# Altium footprint library Stabiliser.PcbLib: 128 footprints (part 8 of 8)
Each footprint in its own frame and in the unit in brackets; x right, y up, seen from the top. Pads: shape width x height; smd on the part's side, far side on the other; paste and mask are expansions set on the pad; w line width, h text height; cw(c..) or ccw(c..) is an arc to the next point about the centre after c.
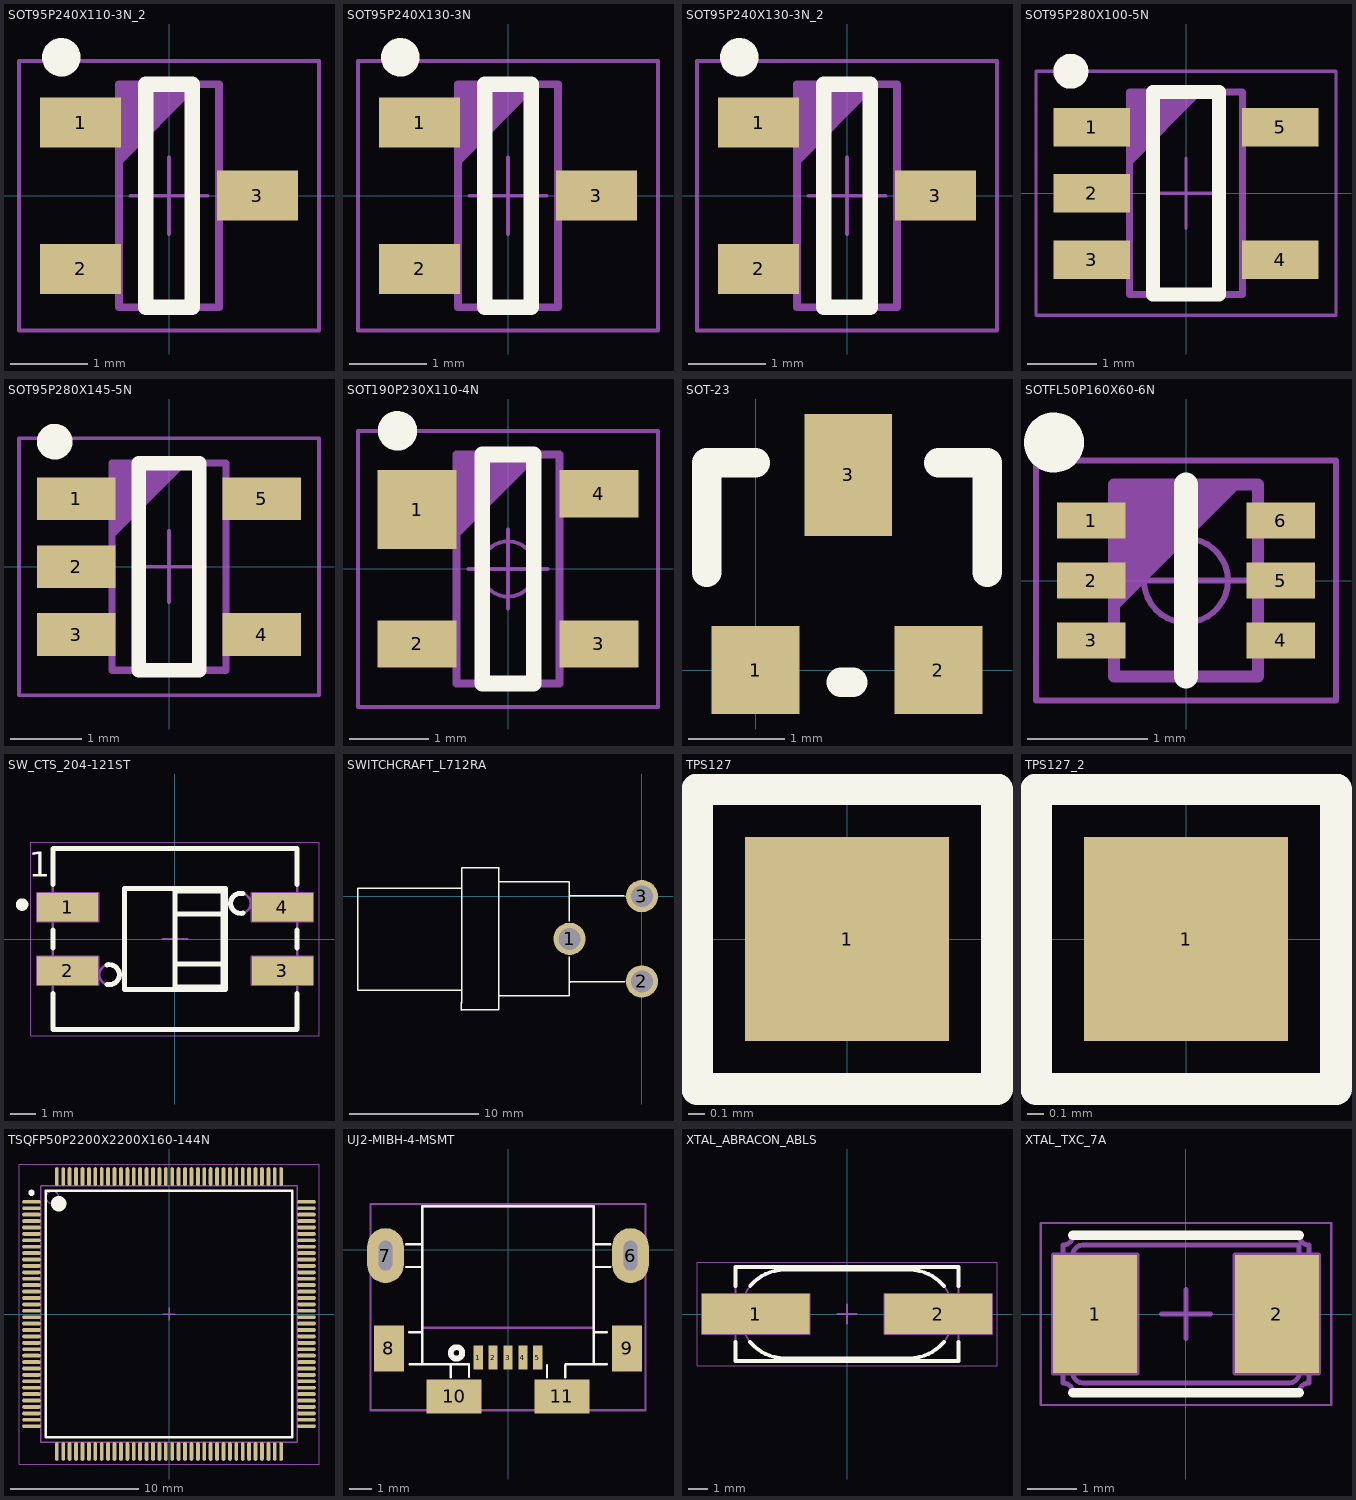
[diagram p7: the footprints below, top view; thin cyan lines are the x and y axes]

## SOT95P240X110-3N_2 [mm]
pads (3):
  rect 1.05x0.65 smd: 1(-1.15,0.95) 2(-1.15,-0.95) 3(1.15,0)
Top Overlay:
  circle w0.25: c-1.4,1.8 r0.125
  lines w0.2: -0.3,-1.45 0.3,-1.45 0.3,1.45 -0.3,1.45 -0.3,-1.45
Mechanical 14:
  lines w0.1: -0.65,0.45 0.35,1.45 ; -0.65,0.55 0.25,1.45 ; -0.65,0.65 0.15,1.45 ; -0.65,0.75 0.05,1.45 ; -0.65,0.85 -0.05,1.45 ; -0.65,0.95 -0.15,1.45 ; -0.65,1.05 -0.25,1.45 ; -0.65,1.15 -0.35,1.45 ; -0.65,1.25 -0.45,1.45 ; -0.65,1.35 -0.55,1.45 ; -0.65,-1.45 -0.65,1.45 0.65,1.45 0.65,-1.45 -0.65,-1.45
Mechanical 15:
  lines w0.05: -0.5,0 0.5,0 ; 0,-0.5 0,0.5 ; -1.95,-1.75 -1.95,1.75 1.95,1.75 1.95,-1.75 -1.95,-1.75
3D body "SOT95P240X110-3N.stp": height 1.1, standoff 0, extent -1.25,-1.5 1.25,1.5

## SOT95P240X130-3N [mm] "SOT23 3-Leads, Pitch 0.95mm - Body 1.3x2.9mm, IPC Medium Density"
height 1.3
pads (3):
  rect 1.05x0.65 smd: 1(-1.15,0.95) 2(-1.15,-0.95) 3(1.15,0)
Top Overlay:
  circle w0.25: c-1.4,1.8 r0.125
  lines w0.2: -0.3,-1.45 0.3,-1.45 0.3,1.45 -0.3,1.45 -0.3,-1.45
Mechanical 14:
  lines w0.1: -0.65,0.45 0.35,1.45 ; -0.65,0.55 0.25,1.45 ; -0.65,0.65 0.15,1.45 ; -0.65,0.75 0.05,1.45 ; -0.65,0.85 -0.05,1.45 ; -0.65,0.95 -0.15,1.45 ; -0.65,1.05 -0.25,1.45 ; -0.65,1.15 -0.35,1.45 ; -0.65,1.25 -0.45,1.45 ; -0.65,1.35 -0.55,1.45 ; -0.65,-1.45 -0.65,1.45 0.65,1.45 0.65,-1.45 -0.65,-1.45
Mechanical 15:
  lines w0.05: -0.5,0 0.5,0 ; 0,-0.5 0,0.5 ; -1.95,-1.75 -1.95,1.75 1.95,1.75 1.95,-1.75 -1.95,-1.75
3D body "SOT95P240X130-3N.stp": height 1.3, standoff 0, extent -1.25,-1.5 1.25,1.5

## SOT95P240X130-3N_2 [mm]
pads (3):
  rect 1.05x0.65 smd: 1(-1.15,0.95) 2(-1.15,-0.95) 3(1.15,0)
Top Overlay:
  circle w0.25: c-1.4,1.8 r0.125
  lines w0.2: -0.3,-1.45 -0.3,1.45 0.3,1.45 0.3,-1.45 -0.3,-1.45
Mechanical 14:
  lines w0.1: -0.65,0.45 0.35,1.45 ; -0.65,0.55 0.25,1.45 ; -0.65,0.65 0.15,1.45 ; -0.65,0.75 0.05,1.45 ; -0.65,0.85 -0.05,1.45 ; -0.65,0.95 -0.15,1.45 ; -0.65,1.05 -0.25,1.45 ; -0.65,1.15 -0.35,1.45 ; -0.65,1.25 -0.45,1.45 ; -0.65,1.35 -0.55,1.45 ; -0.65,-1.45 0.65,-1.45 0.65,1.45 -0.65,1.45 -0.65,-1.45
Mechanical 15:
  lines w0.05: -0.5,0 0.5,0 ; 0,-0.5 0,0.5 ; -1.95,-1.75 1.95,-1.75 1.95,1.75 -1.95,1.75 -1.95,-1.75
3D body "SOT95P240X130-3N.stp": height 1.3, standoff 0, extent -1.25,-1.5 1.25,1.5

## SOT95P280X100-5N [mm] "SOT23, 0.95mm pitch; 5 pin, 1.625mm W X 2.9mm L, IPC Medium Density"
height 1
pads (5):
  rect 1.1x0.55 smd: 1(-1.35,0.95) 2(-1.35,0) 3(-1.35,-0.95) 4(1.35,-0.95) 5(1.35,0.95)
Top Overlay:
  circle w0.25: c-1.65,1.75 r0.125
  lines w0.2: -0.475,-1.45 0.475,-1.45 0.475,1.45 -0.475,1.45 -0.475,-1.45
Mechanical 14:
  lines w0.1: -0.812,0.45 0.188,1.45 ; -0.812,0.55 0.088,1.45 ; -0.812,0.65 -0.012,1.45 ; -0.812,0.75 -0.112,1.45 ; -0.812,0.85 -0.212,1.45 ; -0.812,0.95 -0.312,1.45 ; -0.812,1.05 -0.412,1.45 ; -0.812,1.15 -0.512,1.45 ; -0.812,1.25 -0.612,1.45 ; -0.812,1.35 -0.712,1.45 ; -0.812,-1.45 0.812,-1.45 0.812,1.45 -0.812,1.45 -0.812,-1.45
Mechanical 15:
  lines w0.05: -0.5,0 0.5,0 ; 0,-0.5 0,0.5 ; -2.15,-1.75 2.15,-1.75 2.15,1.75 -2.15,1.75 -2.15,-1.75
3D body "SOT95P280X100-5N.stp": height 1, standoff 0, extent -1.4,-1.5 1.4,1.5

## SOT95P280X145-5N [mm] "SOT, 0.95mm pitch; 5 pin, 1.60mm W X 2.90mm L X 1.45mm H body, IPC Medium Density"
height 1.45
pads (5):
  rect 1.1x0.6 smd: 1(-1.3,0.95) 2(-1.3,0) 3(-1.3,-0.95) 4(1.3,-0.95) 5(1.3,0.95)
Top Overlay:
  circle w0.25: c-1.6,1.75 r0.125
  lines w0.2: -0.425,-1.45 0.425,-1.45 0.425,1.45 -0.425,1.45 -0.425,-1.45
Mechanical 14:
  lines w0.1: -0.8,0.45 0.2,1.45 ; -0.8,0.55 0.1,1.45 ; -0.8,0.65 0,1.45 ; -0.8,0.75 -0.1,1.45 ; -0.8,0.85 -0.2,1.45 ; -0.8,0.95 -0.3,1.45 ; -0.8,1.05 -0.4,1.45 ; -0.8,1.15 -0.5,1.45 ; -0.8,1.25 -0.6,1.45 ; -0.8,1.35 -0.7,1.45 ; -0.8,-1.45 0.8,-1.45 0.8,1.45 -0.8,1.45 -0.8,-1.45
Mechanical 15:
  lines w0.05: -0.5,0 0.5,0 ; 0,-0.5 0,0.5 ; -2.1,-1.8 2.1,-1.8 2.1,1.8 -2.1,1.8 -2.1,-1.8
3D body "SOT95P280X145-5N.stp": height 1.45, standoff 0, extent -1.4,-1.5 1.4,1.5

## SOT190P230X110-4N [mm] "SOT143, SOT, 1.90mm Pitch; 4 Pin, 1.30mm W X 2.90mm L X 1.10mm H body, IPC Medium Density"
height 1.1
pads (4):
  rect 1x1 smd: 1(-1.15,0.75)
  rect 1x0.6 smd: 2(-1.15,-0.95) 3(1.15,-0.95) 4(1.15,0.95)
Top Overlay:
  circle w0.25: c-1.4,1.75 r0.125
  lines w0.2: -0.325,-1.45 0.325,-1.45 0.325,1.45 -0.325,1.45 -0.325,-1.45
Mechanical 14:
  lines w0.1: -0.65,0.45 0.35,1.45 ; -0.65,0.55 0.25,1.45 ; -0.65,0.65 0.15,1.45 ; -0.65,0.75 0.05,1.45 ; -0.65,0.85 -0.05,1.45 ; -0.65,0.95 -0.15,1.45 ; -0.65,1.05 -0.25,1.45 ; -0.65,1.15 -0.35,1.45 ; -0.65,1.25 -0.45,1.45 ; -0.65,1.35 -0.55,1.45 ; -0.65,-1.45 0.65,-1.45 0.65,1.45 -0.65,1.45 -0.65,-1.45
Mechanical 15:
  circle w0.05: c0,0 r0.35
  lines w0.05: -0.5,0 0.5,0 ; 0,-0.5 0,0.5 ; -1.9,-1.75 1.9,-1.75 1.9,1.75 -1.9,1.75 -1.9,-1.75
3D body "SOT143N.stp": height 1.1, standoff 0, extent -1.25,-1.5 1.25,1.5

## SOT-23 [mil]
pads (3):
  rect 36x36 smd: 1(0,0) 2(75,0)
  rect 36x50 smd: 3(38,80)
Top Overlay:
  lines w12: -20,40 -20,85 0,85 ; 35,-5 40,-5 ; 75,85 95,85 95,40
3D body "SOT95P229X119-3N.stp": height 46.85, standoff 0.08, extent -21,-5.21 97.11,93.21

## SOTFL50P160X60-6N [mm] "SOTFL (SOT666), 0.50mm, Pitch; 6 Pin, 1.20mm W X 1.60mm L X 0.60mm H Body, IPC Medium Density"
height 0.6
pads (6):
  rect 0.57x0.3 smd: 1(-0.79,0.5) 2(-0.79,0) 3(-0.79,-0.5) 4(0.79,-0.5) 5(0.79,0) 6(0.79,0.5)
Top Overlay:
  circle w0.25: c-1.1,1.15 r0.125
  lines w0.2: 0,-0.8 0,0.8
Mechanical 14:
  lines w0.1: -0.6,-0.2 0.4,0.8 ; -0.6,-0.1 0.3,0.8 ; -0.6,0 0.2,0.8 ; -0.6,0.1 0.1,0.8 ; -0.6,0.2 0,0.8 ; -0.6,0.3 -0.1,0.8 ; -0.6,0.4 -0.2,0.8 ; -0.6,0.5 -0.3,0.8 ; -0.6,0.6 -0.4,0.8 ; -0.6,0.7 -0.5,0.8 ; -0.6,-0.8 -0.6,0.8 0.6,0.8 0.6,-0.8 -0.6,-0.8
Mechanical 15:
  circle w0.05: c0,0 r0.35
  lines w0.05: -0.5,0 0.5,0 ; 0,-0.5 0,0.5 ; -1.25,-1 -1.25,1 1.25,1 1.25,-1 -1.25,-1
3D body "SOTFL50P160X60-6N.stp": height 0.6, standoff 0, extent -0.85,-0.85 0.85,0.85

## SW_CTS_204-121ST [mm] "Body 7.26 x 9.78mm SPDT DIP Switch, 204 Series"
height 10.36
pads (4):
  rect 2.44x1.13 smd: 1(-4.3,1.27) 2(-4.3,-1.27) 3(4.3,-1.27) 4(4.3,1.27)
Top Overlay:
  circle w0.25: c-6.125,1.38 r0.125
  lines w0.2: -4.89,-2.185 -4.89,-3.63 4.89,-3.63 4.89,-2.185 ; -4.89,-0.355 -4.89,0.355 ; -4.89,2.185 -4.89,3.63 4.89,3.63 4.89,2.185 ; -2.73,-1.817 ccw(c-2.63,-1.43) -2.73,-1.043 ; 0,-1 1.93,-1 ; 0,1 1.93,1 ; 2.73,1.043 cw(c2.63,1.43) 2.73,1.817 ; 4.89,-0.355 4.89,0.355 ; -2.03,-2.03 -2.03,2.03 2.03,2.03 2.03,-2.03 -2.03,-2.03 ; 0,-1.93 1.93,-1.93 1.93,1.93 0,1.93 0,-1.93
  text "1" at -5.86,2.499 h1
Mechanical 8:
  lines w0.1: -0.5,0 0,0 ; 0,-0.5 0,0 ; 0,0.5 0,0 ; 0.5,0 0,0 ; -5.52,-1.835 -4.3,-1.27 -5.52,-0.705 ; -5.52,-1.835 -5.52,-0.705 ; -5.52,-1.835 -3.08,-1.835 -3.08,-0.705 -5.52,-0.705 ; -5.52,0.705 -4.3,1.27 -5.52,1.835 ; -5.52,0.705 -5.52,1.835 ; -5.52,0.705 -3.08,0.705 -3.08,1.835 -5.52,1.835 ; 5.52,-1.835 4.3,-1.27 5.52,-0.705 ; 5.52,-1.835 3.08,-1.835 3.08,-0.705 5.52,-0.705 ; 5.52,-1.835 5.52,-0.705 ; 5.52,0.705 4.3,1.27 5.52,1.835 ; 5.52,0.705 3.08,0.705 3.08,1.835 5.52,1.835 ; 5.52,0.705 5.52,1.835
Mechanical 14:
  circle w0.1: c-2.63,-1.43 r0.4
  circle w0.1: c2.63,1.43 r0.4
  lines w0.1: -4.89,-1.51 -5.2,-1.51 -5.2,-1.03 -4.89,-1.03 ; -4.89,1.03 -5.2,1.03 -5.2,1.51 -4.89,1.51 ; 0,-1 1.93,-1 ; 0,1 1.93,1 ; 4.89,-1.51 5.2,-1.51 5.2,-1.03 4.89,-1.03 ; 4.89,1.03 5.2,1.03 5.2,1.51 4.89,1.51 ; -4.89,-3.63 4.89,-3.63 4.89,3.63 -4.89,3.63 -4.89,-3.63 ; -2.03,-2.03 -2.03,2.03 2.03,2.03 2.03,-2.03 -2.03,-2.03 ; 0,-1.93 1.93,-1.93 1.93,1.93 0,1.93 0,-1.93
  text "1" at -5.859,2.504 h1
Mechanical 15:
  lines w0.05: -5.77,-3.88 5.77,-3.88 5.77,3.88 -5.77,3.88 -5.77,-3.88
3D body "SW_CTS_204-121ST.stp": height 9.76, standoff 0, extent -5.2,-3.63 5.2,3.63

## SWITCHCRAFT_L712RA [mm] "CONN PWR JACK 2.5X5.5MM SOLDER"
height 5.842
pads (3):
  round 2.5 hole 1.7: 1(-5.6,-3.3) 2(0,-6.6) 3(0,0)
Top Overlay:
  lines w0.1: -13.995,0.61 -21.996,0.61 -21.996,-7.264 -21.971,-7.29 -13.97,-7.29 ; -13.97,-8.204 -13.995,-8.23 -13.995,-8.839 -13.97,-8.814 -11.1,-8.814 -11.1,1.575 ; -13.96,-8.3 -13.96,1.7 -13.96,2.169 -13.919,2.21 -13.64,2.21 -11.049,2.21 -11.1,2.159 -11.1,1.524 ; -11.1,-7.722 -11.096,-7.718 -5.611,-7.718 ; -11.1,1.067 -11.047,1.12 -5.611,1.12 -5.611,-1.928 -5.613,-1.93 ; -5.613,-7.722 -5.613,-4.674 ; -5.588,-6.655 -5.563,-6.629 -1.321,-6.629 ; -5.588,0.025 -5.563,0.051 -1.372,0.051
3D body "L712RAmod.stp": height 13.9, standoff -3.55, extent -21.996,-8.839 1.351,2.185

## TPS127 [mm] "1.27 x  1.27mm SMD Test Point Area"
height 0.95
pads (1):
  rect 1.27x1.27 smd paste-1.27: 1(0,0)
Top Overlay:
  lines w0.2: -0.935,-0.935 0.935,-0.935 0.935,0.935 -0.935,0.935 -0.935,-0.935
Mechanical 14:
  lines w0.1: -0.585,-0.585 0.585,-0.585 0.585,0.585 -0.585,0.585 -0.585,-0.585

## TPS127_2 [mm]
pads (1):
  rect 1.27x1.27 smd paste-1.27: 1(0,0)
Top Overlay:
  lines w0.2: -0.935,-0.935 0.935,-0.935 0.935,0.935 -0.935,0.935 -0.935,-0.935
Mechanical 14:
  lines w0.1: -0.935,-0.935 0.935,-0.935 0.935,0.935 -0.935,0.935 -0.935,-0.935

## TSQFP50P2200X2200X160-144N [mm] "TSQFP, 144-Leads, Body 20.00x20.00mm, Pitch 0.50mm, IPC Medium Density"
height 1.6
pads (144):
  oval 1.45x0.3 smd: 1(-10.725,8.75) 2(-10.725,8.25) 3(-10.725,7.75) 4(-10.725,7.25) 5(-10.725,6.75) 6(-10.725,6.25) 7(-10.725,5.75) 8(-10.725,5.25) 9(-10.725,4.75) 10(-10.725,4.25) 11(-10.725,3.75) 12(-10.725,3.25) 13(-10.725,2.75) 14(-10.725,2.25) 15(-10.725,1.75) 16(-10.725,1.25) 17(-10.725,0.75) 18(-10.725,0.25) 19(-10.725,-0.25) 20(-10.725,-0.75) 21(-10.725,-1.25) 22(-10.725,-1.75) 23(-10.725,-2.25) 24(-10.725,-2.75) 25(-10.725,-3.25) 26(-10.725,-3.75) 27(-10.725,-4.25) 28(-10.725,-4.75) 29(-10.725,-5.25) 30(-10.725,-5.75) 31(-10.725,-6.25) 32(-10.725,-6.75) 33(-10.725,-7.25) 34(-10.725,-7.75) 35(-10.725,-8.25) 36(-10.725,-8.75) 73(10.725,-8.75) 74(10.725,-8.25) 75(10.725,-7.75) 76(10.725,-7.25) 77(10.725,-6.75) 78(10.725,-6.25) 79(10.725,-5.75) 80(10.725,-5.25) 81(10.725,-4.75) 82(10.725,-4.25) 83(10.725,-3.75) 84(10.725,-3.25) 85(10.725,-2.75) 86(10.725,-2.25) 87(10.725,-1.75) 88(10.725,-1.25) 89(10.725,-0.75) 90(10.725,-0.25) 91(10.725,0.25) 92(10.725,0.75) 93(10.725,1.25) 94(10.725,1.75) 95(10.725,2.25) 96(10.725,2.75) 97(10.725,3.25) 98(10.725,3.75) 99(10.725,4.25) 100(10.725,4.75) 101(10.725,5.25) 102(10.725,5.75) 103(10.725,6.25) 104(10.725,6.75) 105(10.725,7.25) 106(10.725,7.75) 107(10.725,8.25) 108(10.725,8.75)
  oval 0.3x1.45 smd: 37(-8.75,-10.725) 38(-8.25,-10.725) 39(-7.75,-10.725) 40(-7.25,-10.725) 41(-6.75,-10.725) 42(-6.25,-10.725) 43(-5.75,-10.725) 44(-5.25,-10.725) 45(-4.75,-10.725) 46(-4.25,-10.725) 47(-3.75,-10.725) 48(-3.25,-10.725) 49(-2.75,-10.725) 50(-2.25,-10.725) 51(-1.75,-10.725) 52(-1.25,-10.725) 53(-0.75,-10.725) 54(-0.25,-10.725) 55(0.25,-10.725) 56(0.75,-10.725) 57(1.25,-10.725) 58(1.75,-10.725) 59(2.25,-10.725) 60(2.75,-10.725) 61(3.25,-10.725) 62(3.75,-10.725) 63(4.25,-10.725) 64(4.75,-10.725) 65(5.25,-10.725) 66(5.75,-10.725) 67(6.25,-10.725) 68(6.75,-10.725) 69(7.25,-10.725) 70(7.75,-10.725) 71(8.25,-10.725) 72(8.75,-10.725) 109(8.75,10.725) 110(8.25,10.725) 111(7.75,10.725) 112(7.25,10.725) 113(6.75,10.725) 114(6.25,10.725) 115(5.75,10.725) 116(5.25,10.725) 117(4.75,10.725) 118(4.25,10.725) 119(3.75,10.725) 120(3.25,10.725) 121(2.75,10.725) 122(2.25,10.725) 123(1.75,10.725) 124(1.25,10.725) 125(0.75,10.725) 126(0.25,10.725) 127(-0.25,10.725) 128(-0.75,10.725) 129(-1.25,10.725) 130(-1.75,10.725) 131(-2.25,10.725) 132(-2.75,10.725) 133(-3.25,10.725) 134(-3.75,10.725) 135(-4.25,10.725) 136(-4.75,10.725) 137(-5.25,10.725) 138(-5.75,10.725) 139(-6.25,10.725) 140(-6.75,10.725) 141(-7.25,10.725) 142(-7.75,10.725) 143(-8.25,10.725) 144(-8.75,10.725)
Top Overlay:
  circle w0.6: c-8.6,8.6 r0.3
  circle w0.25: c-10.725,9.45 r0.125
  lines w0.2: -9.6,-9.6 9.6,-9.6 9.6,9.6 -9.6,9.6 -9.6,-9.6
Mechanical 13:
  circle w0.1: c-9.1,9.1 r0.5
  lines w0.1: -10,-10 10,-10 10,10 -10,10 -10,-10
Mechanical 15:
  lines w0.05: -11.7,-11.7 11.7,-11.7 11.7,11.7 -11.7,11.7 -11.7,-11.7
  lines w0.1: -0.5,0 0.5,0 ; 0,-0.5 0,0.5
3D body "TSQFP50P2200X2200X160-144N.step": height 1.6, standoff 0, extent -11,-11 11,11

## UJ2-MIBH-4-MSMT [mm] "Micro USB mid mount"
height 10.94
pads (11):
  rect 0.4x1.05 smd: 1(-1.3,-4.7) 2(-0.65,-4.7) 3(0,-4.7) 4(0.65,-4.7) 5(1.3,-4.7)
  oval 1.6x2.4 hole 0.6 slot 1.3 at 90 deg: 6(5.35,-0.25) 7(-5.35,-0.25)
  rect 1.3x2 smd: 8(-5.2,-4.3) 9(5.2,-4.3)
  rect 2.4x1.5 smd: 10(-2.35,-6.4) 11(2.35,-6.4)
Top Overlay:
  circle w0.254: c-2.25,-4.5 r0.25
  lines w0.1: -4.45,-0.75 -3.75,-0.75 ; -4.45,0.25 -3.75,0.25 ; -4.325,-3.6 -3.75,-3.6 ; -4.3,-5 -1.7,-5 -1.7,-5.55 ; -3.75,-5 -3.75,-4.8 -3.75,1.9 3.75,1.9 3.75,-4.8 ; -2.5,-5.575 -2.5,-5 ; 1.7,-5.575 1.7,-5.025 ; 2.5,-5.575 2.5,-5.025 2.525,-5 3.75,-5 ; 3.75,-3.6 4.325,-3.6 ; 3.75,-3.2 3.75,-5 ; 3.75,-0.75 4.475,-0.75 ; 3.75,0.25 4.475,0.25 ; 4.325,-5 4.325,-5 3.75,-5 ; 4.475,-0.75 4.475,-0.75
Mechanical 1:
  lines w0.1: -3.75,-3.4 3.75,-3.4 3.75,1.9 -3.75,1.9 -3.75,-3.4
Mechanical 15:
  lines w0.1: -6,-7 -6,2 6,2 6,-7 -6,-7
3D body "CUI_UJ2-MIBH-4-MSMT.step": height 0.9, standoff -1.81, extent -5.5,-6.8 5.5,1.9

## XTAL_ABRACON_ABLS [mm] "HC/49US (AT49) SMD Cristal, Body 11.4x4.7mm, ABLS Serie"
height 4.3
pads (2):
  rect 5.6x2.1 smd: 1(-4.75,0) 2(4.75,0)
Top Overlay:
  lines w0.2: -5.8,-1.45 -5.8,-2.45 5.8,-2.45 ; -5.8,1.45 -5.8,2.45 5.8,2.45 5.8,1.45 ; -5.036,-1.45 ccw(c-3.25,0) -3.25,-2.3 3.25,-2.3 ccw(c3.25,0) 5.035,-1.45 ; -5.035,1.45 cw(c-3.25,0) -3.25,2.299 ; -3.25,2.3 3.25,2.3 cw(c3.25,0) 5.035,1.45 ; 1.45,-2.45 5.8,-2.45 ; 5.8,-1.45 5.8,-2.45
Mechanical 8:
  lines w0.1: -5.75,0 -4.75,0 ; -5.25,0 -4.75,0 ; -4.75,-1 -4.75,0 ; -4.75,-0.5 -4.75,0 ; -4.75,0.5 -4.75,0 ; -4.75,1 -4.75,0 ; -4.25,0 -4.75,0 ; -3.75,0 -4.75,0 ; -0.5,0 0,0 ; 0,-0.5 0,0 ; 0,0.5 0,0 ; 0.5,0 0,0 ; 3.75,0 4.75,0 ; 4.25,0 4.75,0 ; 4.75,-1 4.75,0 ; 4.75,-0.5 4.75,0 ; 4.75,0.5 4.75,0 ; 4.75,1 4.75,0 ; 5.25,0 4.75,0 ; 5.75,0 4.75,0 ; -7.55,-1.05 -1.95,-1.05 -1.95,1.05 -7.55,1.05 -7.55,-1.05 ; 1.95,-1.05 7.55,-1.05 7.55,1.05 1.95,1.05 1.95,-1.05
Mechanical 14:
  lines w0.1: -5.8,-0.3 -6.6,-0.3 -6.6,0.3 -5.8,0.3 ; -3.25,2.299 ccw(c-3.25,0) -3.25,-2.3 3.25,-2.3 ccw(c3.25,0) 3.25,2.3 -3.25,2.3 ; 5.8,-0.3 6.6,-0.3 6.6,0.3 5.8,0.3 ; -5.8,-2.45 5.8,-2.45 5.8,2.45 -5.8,2.45 -5.8,-2.45
Mechanical 15:
  lines w0.05: -7.8,-2.7 -7.8,2.7 7.8,2.7 7.8,-2.7 -7.8,-2.7
3D body "XTAL_ABRACON_ABLS.stp": height 4.2, standoff 0, extent -6.6,-2.45 6.6,2.45

## XTAL_TXC_7A [mm] "2 Pins, 3.2x5mm, SMD Glass Seam Sealing Crystal, 7A Serie"
height 1.2
pads (2):
  rect 1.7x2.4 smd: 1(-1.85,0) 2(1.85,0)
Top Overlay:
  lines w0.2: -2.3,-1.6 2.3,-1.6 ; -2.3,1.6 2.3,1.6
Mechanical 8:
  lines w0.1: -2.35,0 -1.85,0 ; -1.85,-0.5 -1.85,0 ; -1.85,0.5 -1.85,0 ; -1.35,0 -1.85,0 ; -0.5,0 0,0 ; 0,-0.5 0,0 ; 0,0.5 0,0 ; 0.5,0 0,0 ; 1.35,0 1.85,0 ; 1.85,-0.5 1.85,0 ; 1.85,0.5 1.85,0 ; 2.35,0 1.85,0 ; -2.7,-1.2 -1,-1.2 -1,1.2 -2.7,1.2 -2.7,-1.2 ; 1,-1.2 2.7,-1.2 2.7,1.2 1,1.2 1,-1.2
Mechanical 14:
  lines w0.1: -2.5,-1.4 cw(c-2.5,-1.6) -2.3,-1.6 2.3,-1.6 cw(c2.5,-1.6) 2.5,-1.4 2.5,-0.5 cw(c2.5,-0.4) 2.4,-0.4 2.4,0.4 cw(c2.5,0.4) 2.5,0.5 2.5,1.4 cw(c2.5,1.6) 2.3,1.6 -2.3,1.6 cw(c-2.5,1.6) -2.5,1.4 -2.5,0.5 cw(c-2.5,0.4) -2.4,0.4 -2.4,-0.4 cw(c-2.5,-0.4) -2.5,-0.5 -2.5,-1.4 ; -2.3,-1.2 ccw(c-2.1,-1.2) -2.1,-1.4 2.1,-1.4 ccw(c2.1,-1.2) 2.3,-1.2 2.3,1.4 -2.1,1.4 ccw(c-2.1,1.2) -2.3,1.2 -2.3,-1.2
Mechanical 15:
  lines w0.05: -2.95,-1.85 2.95,-1.85 2.95,1.85 -2.95,1.85 -2.95,-1.85
3D body "XTAL_TXC_7A.stp": height 1.2, standoff 0, extent -2.501,-1.6 2.5,1.6